# Altium footprint library Libraries_2014_0618.PcbLib: 391 footprints (part 8 of 25)
Each footprint in its own frame and in the unit in brackets; x right, y up, seen from the top. Pads: shape width x height; smd on the part's side, far side on the other; paste and mask are expansions set on the pad; w line width, h text height; cw(c..) or ccw(c..) is an arc to the next point about the centre after c.
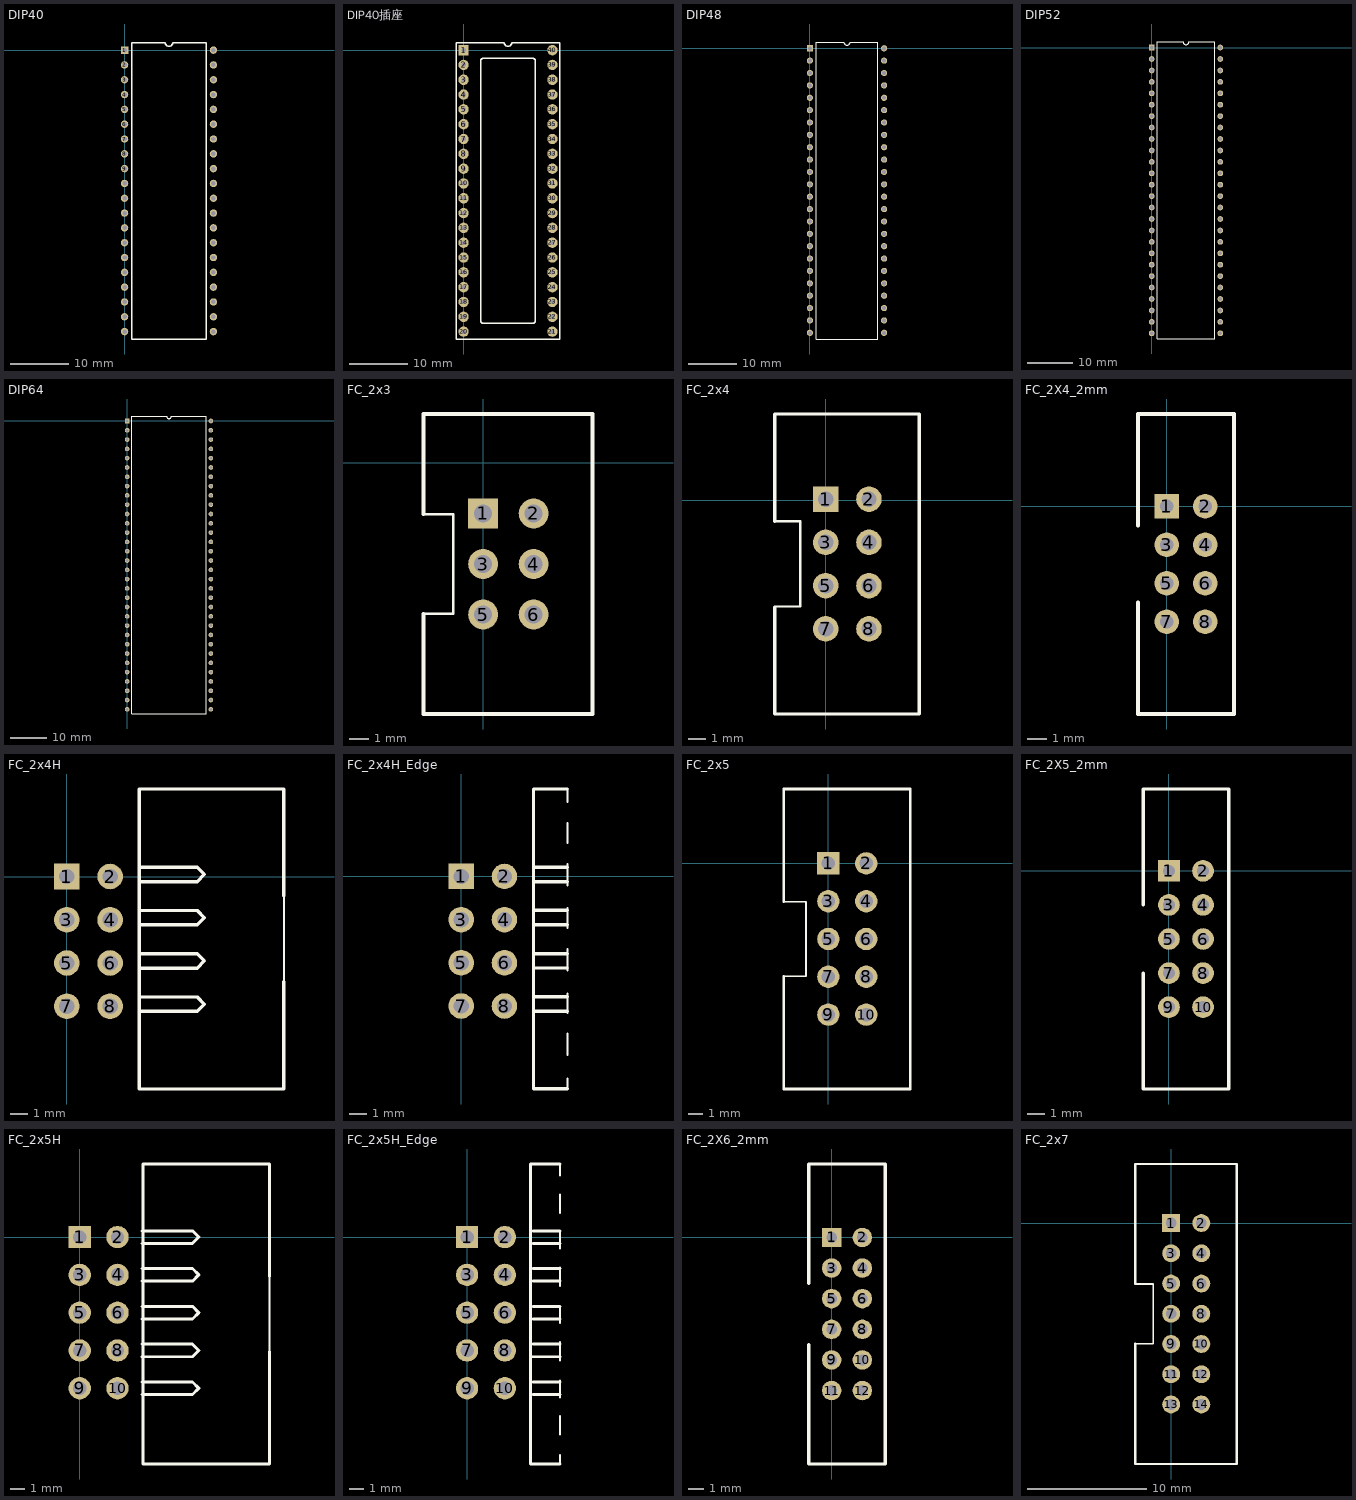
[diagram p7: the footprints below, top view; thin cyan lines are the x and y axes]

## DIP40 [mil]
pads (40):
  rect 50x50 hole 30: 1(0,0)
  round 50 hole 30: 2(0,-100) 3(0,-200) 4(0,-300) 5(0,-400) 6(0,-500) 7(0,-600) 8(0,-700) 9(0,-800) 10(0,-900) 11(0,-1000) 12(0,-1100) 13(0,-1200) 14(0,-1300) 15(0,-1400) 16(0,-1500) 17(0,-1600) 18(0,-1700) 19(0,-1800) 20(0,-1900) 21(600,-1900) 22(600,-1800) 23(600,-1700) 24(600,-1600) 25(600,-1500) 26(600,-1400) 27(600,-1300) 28(600,-1200) 29(600,-1100) 30(600,-1000) 31(600,-900) 32(600,-800) 33(600,-700) 34(600,-600) 35(600,-500) 36(600,-400) 37(600,-300) 38(600,-200) 39(600,-100) 40(600,0)
Top Overlay:
  lines w10: 50,-1950 550,-1950 550,50 325,50 cw(c300,50) 275,50 50,50 50,-1950

## DIP40插座 [mil]
pads (40):
  rect 70x70 hole 30: 1(0,0)
  round 70 hole 30: 2(0,-100) 3(0,-200) 4(0,-300) 5(0,-400) 6(0,-500) 7(0,-600) 8(0,-700) 9(0,-800) 10(0,-900) 11(0,-1000) 12(0,-1100) 13(0,-1200) 14(0,-1300) 15(0,-1400) 16(0,-1500) 17(0,-1600) 18(0,-1700) 19(0,-1800) 20(0,-1900) 21(600,-1900) 22(600,-1800) 23(600,-1700) 24(600,-1600) 25(600,-1500) 26(600,-1400) 27(600,-1300) 28(600,-1200) 29(600,-1100) 30(600,-1000) 31(600,-900) 32(600,-800) 33(600,-700) 34(600,-600) 35(600,-500) 36(600,-400) 37(600,-300) 38(600,-200) 39(600,-100) 40(600,0)
Top Overlay:
  lines w10: -50,-1950 -50,50 275,50 ccw(c300,50) 325,50 650,50 650,-1950 -50,-1950 ; 115,-1825 ccw(c135,-1825) 135,-1845 465,-1845 ccw(c465,-1825) 485,-1825 485,-75 ccw(c465,-75) 465,-55 135,-55 ccw(c135,-75) 115,-75 115,-1825

## DIP48 [mil]
pads (48):
  rect 50x50 hole 32: 1(0,0)
  round 50 hole 32: 2(0,-100) 3(0,-200) 4(0,-300) 5(0,-400) 6(0,-500) 7(0,-600) 8(0,-700) 9(0,-800) 10(0,-900) 11(0,-1000) 12(0,-1100) 13(0,-1200) 14(0,-1300) 15(0,-1400) 16(0,-1500) 17(0,-1600) 18(0,-1700) 19(0,-1800) 20(0,-1900) 21(0,-2000) 22(0,-2100) 23(0,-2200) 24(0,-2300) 25(600,-2300) 26(600,-2200) 27(600,-2100) 28(600,-2000) 29(600,-1900) 30(600,-1800) 31(600,-1700) 32(600,-1600) 33(600,-1500) 34(600,-1400) 35(600,-1300) 36(600,-1200) 37(600,-1100) 38(600,-1000) 39(600,-900) 40(600,-800) 41(600,-700) 42(600,-600) 43(600,-500) 44(600,-400) 45(600,-300) 46(600,-200) 47(600,-100) 48(600,0)
Top Overlay:
  lines w10: 50,-2350 50,50 275,50 ccw(c300,50) 325,50 550,50 550,-2350 50,-2350

## DIP52 [mil]
pads (52):
  rect 50x50 hole 32: 1(0,0)
  round 50 hole 32: 2(0,-100) 3(0,-200) 4(0,-300) 5(0,-400) 6(0,-500) 7(0,-600) 8(0,-700) 9(0,-800) 10(0,-900) 11(0,-1000) 12(0,-1100) 13(0,-1200) 14(0,-1300) 15(0,-1400) 16(0,-1500) 17(0,-1600) 18(0,-1700) 19(0,-1800) 20(0,-1900) 21(0,-2000) 22(0,-2100) 23(0,-2200) 24(0,-2300) 25(0,-2400) 26(0,-2500) 27(600,-2500) 28(600,-2400) 29(600,-2300) 30(600,-2200) 31(600,-2100) 32(600,-2000) 33(600,-1900) 34(600,-1800) 35(600,-1700) 36(600,-1600) 37(600,-1500) 38(600,-1400) 39(600,-1300) 40(600,-1200) 41(600,-1100) 42(600,-1000) 43(600,-900) 44(600,-800) 45(600,-700) 46(600,-600) 47(600,-500) 48(600,-400) 49(600,-300) 50(600,-200) 51(600,-100) 52(600,0)
Top Overlay:
  lines w10: 50,-2550 550,-2550 550,50 325,50 cw(c300,50) 275,50 50,50 50,-2550

## DIP64 [mil]
pads (64):
  rect 50x50 hole 32: 1(0,0)
  round 50 hole 32: 2(0,-100) 3(0,-200) 4(0,-300) 5(0,-400) 6(0,-500) 7(0,-600) 8(0,-700) 9(0,-800) 10(0,-900) 11(0,-1000) 12(0,-1100) 13(0,-1200) 14(0,-1300) 15(0,-1400) 16(0,-1500) 17(0,-1600) 18(0,-1700) 19(0,-1800) 20(0,-1900) 21(0,-2000) 22(0,-2100) 23(0,-2200) 24(0,-2300) 25(0,-2400) 26(0,-2500) 27(0,-2600) 28(0,-2700) 29(0,-2800) 30(0,-2900) 31(0,-3000) 32(0,-3100) 33(900,-3100) 34(900,-3000) 35(900,-2900) 36(900,-2800) 37(900,-2700) 38(900,-2600) 39(900,-2500) 40(900,-2400) 41(900,-2300) 42(900,-2200) 43(900,-2100) 44(900,-2000) 45(900,-1900) 46(900,-1800) 47(900,-1700) 48(900,-1600) 49(900,-1500) 50(900,-1400) 51(900,-1300) 52(900,-1200) 53(900,-1100) 54(900,-1000) 55(900,-900) 56(900,-800) 57(900,-700) 58(900,-600) 59(900,-500) 60(900,-400) 61(900,-300) 62(900,-200) 63(900,-100) 64(900,0)
Top Overlay:
  lines w10: 50,-3150 850,-3150 850,50 475,50 cw(c450,50) 425,50 50,50 50,-3150

## FC_2x3 [mm] "Connector; Header; 6x2 Position"
pads (6):
  rect 1.5x1.5 hole 0.9: 1(0,-2.54)
  round 1.5 hole 0.9: 2(2.54,-2.54) 3(0,-5.08) 4(2.54,-5.08) 5(0,-7.62) 6(2.54,-7.62)
Top Overlay:
  lines w0.127: -3,-7.58 -1.5,-7.58 -1.5,-2.58 -3,-2.58
  lines w0.2: -3,-7.6 -3,-10.12 -3,-12.62 5.5,-12.62 5.5,2.46 -3,2.46 -3,-0.04 -3,-2.56

## FC_2x4 [mm] "Connector; Header; 6x2 Position"
pads (8):
  rect 1.5x1.5 hole 0.9: 1(0,0.08)
  round 1.5 hole 0.9: 2(2.54,0.08) 3(0,-2.46) 4(2.54,-2.46) 5(0,-5) 6(2.54,-5) 7(0,-7.54) 8(2.54,-7.54)
Top Overlay:
  lines w0.127: -3,-6.22 -1.5,-6.22 -1.5,-1.22 -3,-1.22
  lines w0.2: -3,-6.27 -3,-8.79 -3,-12.54 5.5,-12.54 5.5,5.08 -3,5.08 -3,0.04 -3,-1.22

## FC_2X4_2mm [mm]
pads (8):
  rect 1.27x1.27 hole 0.7: 1(0,0)
  round 1.27 hole 0.7: 2(2,0) 3(0,-2) 4(2,-2) 5(0,-4) 6(2,-4) 7(0,-6) 8(2,-6)
Top Overlay:
  lines w0.2: -1.5,-5 -1.5,-10.8 3.5,-10.8 3.5,4.8 -1.5,4.8 -1.5,-1

## FC_2x4H [mm] "Connector; Header; 6x2 Position"
pads (8):
  rect 1.5x1.5 hole 0.9: 1(0,0)
  round 1.5 hole 0.9: 2(2.54,0) 3(0,-2.54) 4(2.54,-2.54) 5(0,-5.08) 6(2.54,-5.08) 7(0,-7.62) 8(2.54,-7.62)
Top Overlay:
  lines w0.127: 12.75,-6.18 12.75,-1.18
  lines w0.2: 4.27,-7.923 7.657,-7.923 8.08,-7.5 7.657,-7.077 4.27,-7.077 ; 4.27,-5.383 7.657,-5.383 8.08,-4.96 7.657,-4.537 4.27,-4.537 ; 4.27,-2.843 7.657,-2.843 8.08,-2.42 7.657,-1.997 4.27,-1.997 ; 4.27,-0.303 7.657,-0.303 8.08,0.12 7.657,0.543 4.27,0.543 ; 12.75,-6.18 12.75,-7.44 12.75,-12.48 4.25,-12.48 4.25,5.14 12.75,5.14 12.75,1.39 12.75,-1.13

## FC_2x4H_Edge [mm] "Connector; Header; 6x2 Position"
pads (8):
  rect 1.5x1.5 hole 0.9: 1(0,0)
  round 1.5 hole 0.9: 2(2.54,0) 3(0,-2.54) 4(2.54,-2.54) 5(0,-5.08) 6(2.54,-5.08) 7(0,-7.62) 8(2.54,-7.62)
Top Overlay:
  lines w0.127: 6.25,-12.5 6.25,-11.875 ; 6.25,-10.5 6.25,-9.25 ; 6.25,-8.035 6.25,-6.875 ; 6.25,-5.535 6.25,-4.285 ; 6.25,-3.035 6.25,-1.875 ; 6.25,-0.535 6.25,0.715 ; 6.25,1.965 6.25,3.125 ; 6.25,4.375 6.25,5.14
  lines w0.2: 4.27,-7.923 6.25,-7.923 ; 4.27,-7.077 6.25,-7.077 ; 4.27,-5.383 6.25,-5.383 ; 4.27,-4.537 6.25,-4.537 ; 4.27,-2.843 6.25,-2.843 ; 4.27,-1.997 6.25,-1.997 ; 4.27,-0.303 6.25,-0.303 ; 4.27,0.543 6.25,0.543 ; 6.25,-12.48 4.25,-12.48 4.25,5.14 6.25,5.14

## FC_2x5 [mm] "Connector; Header; 6x2 Position"
pads (10):
  rect 1.5x1.5 hole 0.9: 1(0,0)
  round 1.5 hole 0.9: 2(2.54,0) 3(0,-2.54) 4(2.54,-2.54) 5(0,-5.08) 6(2.54,-5.08) 7(0,-7.62) 8(2.54,-7.62) 9(0,-10.16) 10(2.54,-10.16)
Top Overlay:
  lines w0.127: -3,-7.58 -1.5,-7.58 -1.5,-2.58 -3,-2.58
  lines w0.2: -3,-7.6 -3,-10.12 -3,-15.16 5.5,-15.16 5.5,5 -3,5 -3,-0.04 -3,-2.56

## FC_2X5_2mm [mm]
pads (10):
  rect 1.27x1.27 hole 0.7: 1(0,0)
  round 1.27 hole 0.7: 2(2,0) 3(0,-2) 4(2,-2) 5(0,-4) 6(2,-4) 7(0,-6) 8(2,-6) 9(0,-8) 10(2,-8)
Top Overlay:
  lines w0.2: -1.5,-6 -1.5,-12.8 3.5,-12.8 3.5,4.8 -1.5,4.8 -1.5,-2

## FC_2x5H [mm] "Connector; Header; 6x2 Position"
pads (10):
  rect 1.5x1.5 hole 0.9: 1(0,0)
  round 1.5 hole 0.9: 2(2.54,0) 3(0,-2.54) 4(2.54,-2.54) 5(0,-5.08) 6(2.54,-5.08) 7(0,-7.62) 8(2.54,-7.62) 9(0,-10.16) 10(2.54,-10.16)
Top Overlay:
  lines w0.127: 12.75,-7.67 12.75,-2.67
  lines w0.2: 4.19,-10.583 7.577,-10.583 8,-10.16 7.577,-9.737 4.19,-9.737 ; 4.19,-8.043 7.577,-8.043 8,-7.62 7.577,-7.197 4.19,-7.197 ; 4.19,-5.503 7.577,-5.503 8,-5.08 7.577,-4.657 4.19,-4.657 ; 4.19,-2.963 7.577,-2.963 8,-2.54 7.577,-2.117 4.19,-2.117 ; 4.19,-0.423 7.577,-0.423 8,0 7.577,0.423 4.19,0.423 ; 12.75,-7.69 12.75,-10.21 12.75,-15.25 4.25,-15.25 4.25,4.91 12.75,4.91 12.75,-0.13 12.75,-2.65

## FC_2x5H_Edge [mm] "Connector; Header; 6x2 Position"
pads (10):
  rect 1.5x1.5 hole 0.9: 1(0,0)
  round 1.5 hole 0.9: 2(2.54,0) 3(0,-2.54) 4(2.54,-2.54) 5(0,-5.08) 6(2.54,-5.08) 7(0,-7.62) 8(2.54,-7.62) 9(0,-10.16) 10(2.54,-10.16)
Top Overlay:
  lines w0.127: 6.25,-15.25 6.25,-14.625 ; 6.25,-13.285 6.25,-12.035 ; 6.25,-10.785 6.25,-9.625 ; 6.25,-8.285 6.25,-7.035 ; 6.25,-5.785 6.25,-4.625 ; 6.25,-3.285 6.25,-2.035 ; 6.25,-0.785 6.25,0.375 ; 6.25,1.625 6.25,2.875 ; 6.25,4.125 6.25,4.91
  lines w0.2: 4.44,-10.583 6.25,-10.583 ; 4.44,-9.737 6.25,-9.737 ; 4.44,-8.043 6.25,-8.043 ; 4.44,-7.197 6.25,-7.197 ; 4.44,-5.503 6.25,-5.503 ; 4.44,-4.657 6.25,-4.657 ; 4.44,-2.963 6.25,-2.963 ; 4.44,-2.117 6.25,-2.117 ; 4.44,-0.423 6.25,-0.423 ; 4.44,0.423 6.25,0.423 ; 6.25,-15.25 4.25,-15.25 4.25,4.91 6.25,4.91

## FC_2X6_2mm [mm]
pads (12):
  rect 1.27x1.27 hole 0.7: 1(0,0)
  round 1.27 hole 0.7: 2(2,0) 3(0,-2) 4(2,-2) 5(0,-4) 6(2,-4) 7(0,-6) 8(2,-6) 9(0,-8) 10(2,-8) 11(0,-10) 12(2,-10)
Top Overlay:
  lines w0.2: -1.5,-7 -1.5,-14.8 3.5,-14.8 3.5,4.8 -1.5,4.8 -1.5,-3

## FC_2x7 [mm] "Connector; Header; 6x2 Position"
pads (14):
  rect 1.5x1.5 hole 0.9: 1(0,0)
  round 1.5 hole 0.9: 2(2.54,0) 3(0,-2.54) 4(2.54,-2.54) 5(0,-5.08) 6(2.54,-5.08) 7(0,-7.62) 8(2.54,-7.62) 9(0,-10.16) 10(2.54,-10.16) 11(0,-12.7) 12(2.54,-12.7) 13(0,-15.24) 14(2.54,-15.24)
Top Overlay:
  lines w0.127: -3,-10.12 -1.5,-10.12 -1.5,-5.12 -3,-5.12
  lines w0.2: -3,-10.14 -3,-12.66 -3,-20.24 ; -3,-5.1 -3,-2.58 -3,4.96 5.5,4.96 5.5,-20.24 ; -3,-20.24 5.5,-20.24 ; -3,-20.24 5.5,-20.24